# Altium footprint library Indruino.PcbLib: 383 footprints (part 13 of 24)
Each footprint in its own frame and in the unit in brackets; x right, y up, seen from the top. Pads: shape width x height; smd on the part's side, far side on the other; paste and mask are expansions set on the pad; w line width, h text height; cw(c..) or ccw(c..) is an arc to the next point about the centre after c.
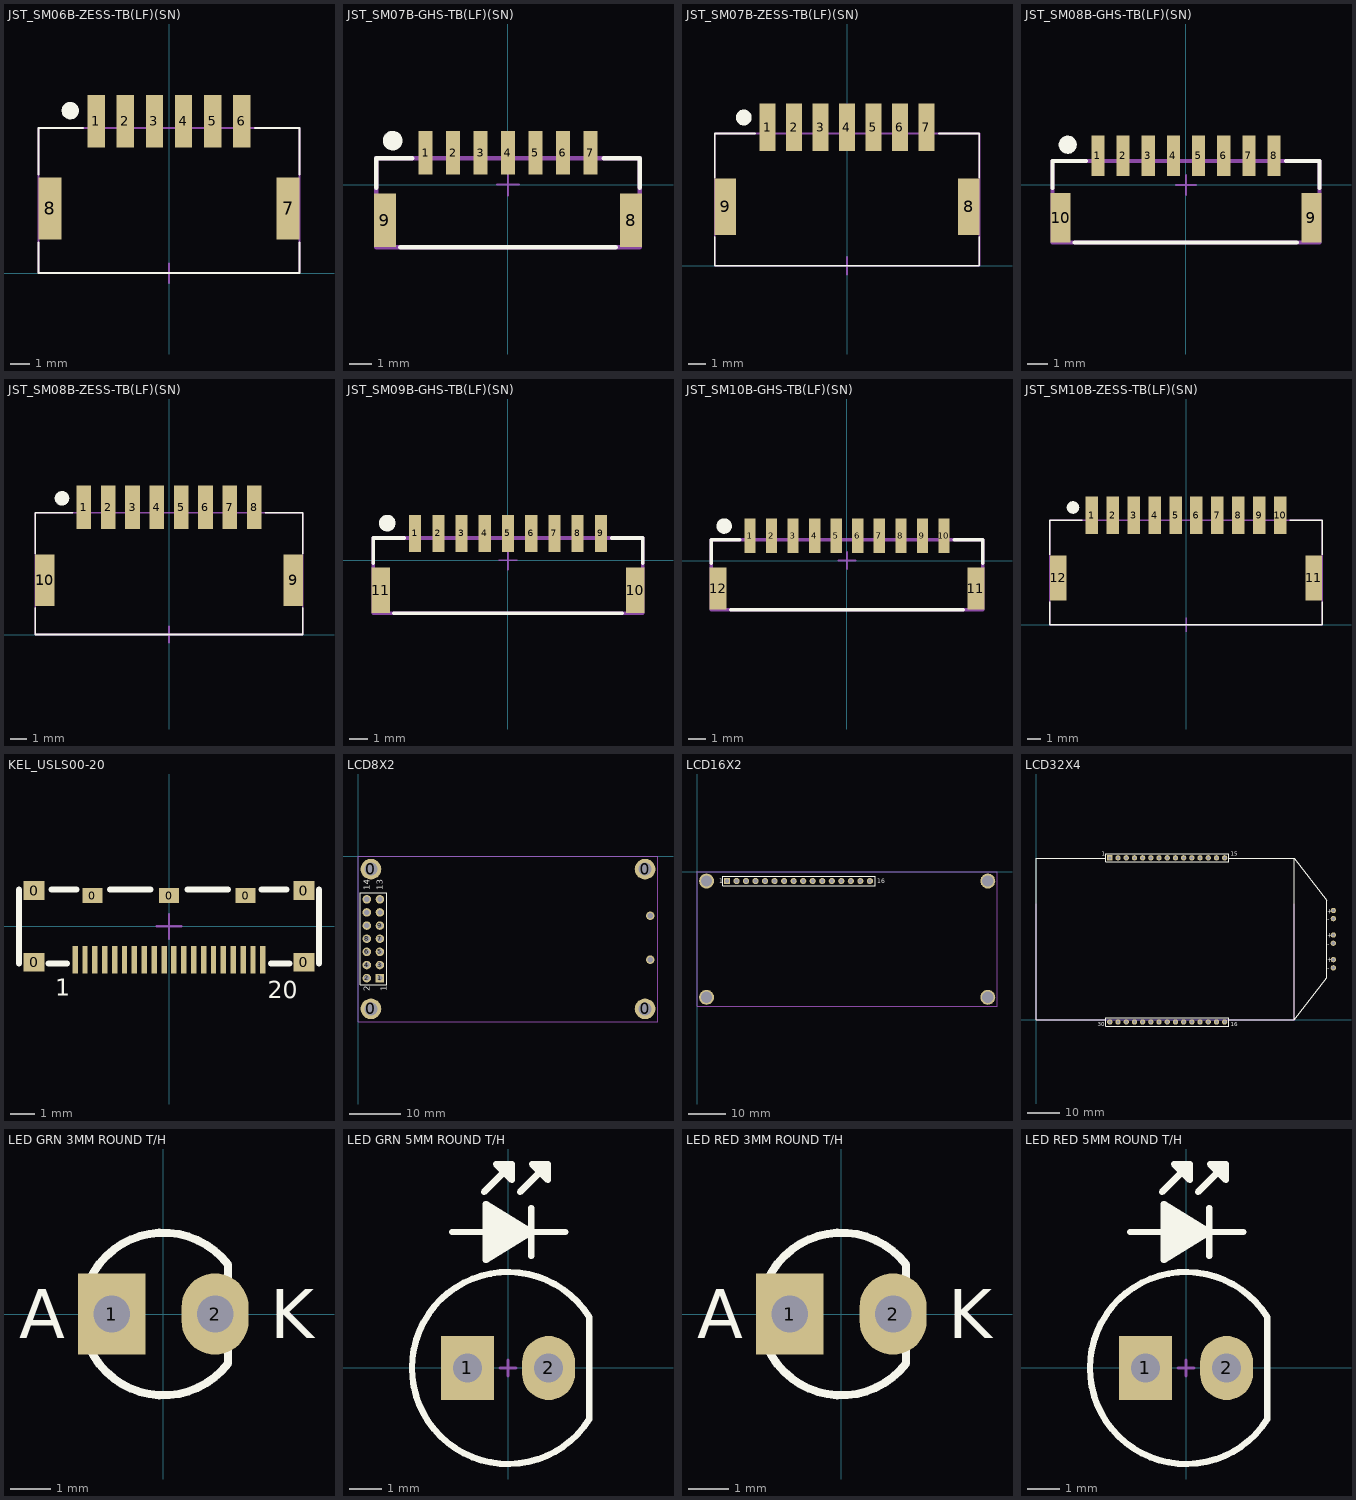
[diagram p12: the footprints below, top view; thin cyan lines are the x and y axes]

## JST_SM06B-ZESS-TB(LF)(SN) [mm]
pads (8):
  rect 0.9x2.7 smd: 1(-3.75,7.85) 2(-2.25,7.85) 3(-0.75,7.85) 4(0.75,7.85) 5(2.25,7.85) 6(3.75,7.85)
  rect 1.2x3.2 smd: 7(6.15,3.35) 8(-6.15,3.35)
Top Overlay:
  circle w0.2: c-5.1,8.4 r0.35
  region: -5.1,8.05 -5.17,8.05 -5.298,8.103 -5.397,8.202 -5.45,8.33 -5.45,8.4 -5.45,8.47 -5.397,8.598 -5.298,8.697 -5.17,8.75 -5.1,8.75 -5.03,8.75 -4.902,8.697 -4.803,8.598 -4.75,8.47 -4.75,8.4 -4.75,8.33 -4.803,8.202 -4.902,8.103 -5.03,8.05
  lines w0.1: -6.75,1.6 -6.75,0 6.75,0 6.75,1.6 ; -6.75,5.1 -6.75,7.5 -4.45,7.5 ; 4.45,7.5 6.75,7.5 6.75,5.1
Mechanical 13:
  lines w0.1: -6.75,0 6.75,0 6.75,7.5 -6.75,7.5 -6.75,0
Mechanical 15:
  lines w0.1: -0.5,0 0.5,0 ; 0,-0.5 0,0.5
3D body "ZER-06V-S.STEP": height 5.9, standoff 0.2, extent -5.4,-1.9 5.4,5.6
3D body "SM06B-ZESS-TB.STEP": height 5.9, standoff 0, extent -6.75,0 6.75,8.7

## JST_SM07B-GHS-TB(LF)(SN) [mm]
pads (9):
  rect 0.65x2 smd: 1(-3.75,1.45) 2(-2.5,1.45) 3(-1.25,1.45) 4(0,1.45) 5(1.25,1.45) 6(2.5,1.45) 7(3.75,1.45)
  rect 1x2.45 smd: 8(5.6,-1.625) 9(-5.6,-1.625)
Top Overlay:
  circle w0.2: c-5.25,2 r0.35
  region: -5.25,1.65 -5.32,1.65 -5.448,1.703 -5.547,1.802 -5.6,1.93 -5.6,2 -5.6,2.07 -5.547,2.198 -5.448,2.297 -5.32,2.35 -5.25,2.35 -5.18,2.35 -5.052,2.297 -4.953,2.198 -4.9,2.07 -4.9,2 -4.9,1.93 -4.953,1.802 -5.052,1.703 -5.18,1.65
  lines w0.2: -6,-0.15 -6,1.2 -4.35,1.2 ; -4.9,-2.85 4.9,-2.85 ; 4.35,1.2 6,1.2 6,-0.15
Mechanical 13:
  lines w0.2: -6,-2.85 6,-2.85 6,1.2 -6,1.2 -6,-2.85
Mechanical 15:
  lines w0.1: -0.5,0 0.5,0 ; 0,-0.5 0,0.5
3D body "SM07B-GHS-TB.STEP": height 4.35, standoff 0, extent -6,-2.85 6,2
3D body "GHR-07V-S.STEP": height 4.43, standoff 0.28, extent -5,-5.96 5,-0.26

## JST_SM07B-ZESS-TB(LF)(SN) [mm]
pads (9):
  rect 0.9x2.7 smd: 1(-4.5,7.85) 2(-3,7.85) 3(-1.5,7.85) 4(0,7.85) 5(1.5,7.85) 6(3,7.85) 7(4.5,7.85)
  rect 1.2x3.2 smd: 8(6.9,3.35) 9(-6.9,3.35)
Top Overlay:
  circle w0.2: c-5.85,8.4 r0.35
  region: -5.85,8.05 -5.92,8.05 -6.048,8.103 -6.147,8.202 -6.2,8.33 -6.2,8.4 -6.2,8.47 -6.147,8.598 -6.048,8.697 -5.92,8.75 -5.85,8.75 -5.78,8.75 -5.652,8.697 -5.553,8.598 -5.5,8.47 -5.5,8.4 -5.5,8.33 -5.553,8.202 -5.652,8.103 -5.78,8.05
  lines w0.1: -7.5,1.65 -7.5,0 7.5,0 7.5,1.65 ; -7.5,5 -7.5,7.5 -5.2,7.5 ; 5.2,7.5 7.5,7.5 7.5,5
Mechanical 13:
  lines w0.1: -7.49,0 -7.49,5.45 -7.49,7.5 5.21,7.5 7.51,7.5 7.51,5.45 7.51,0 -7.49,0
Mechanical 15:
  lines w0.1: -0.5,0 0.5,0 ; 0,-0.5 0,0.5
3D body "ZER-07V-S.STEP": height 5.9, standoff 0.2, extent -6.15,-1.9 6.15,5.6
3D body "SM07B-ZESS-TB.STEP": height 5.9, standoff 0, extent -7.5,0 7.5,8.7

## JST_SM08B-GHS-TB(LF)(SN) [mm]
pads (10):
  rect 0.65x2 smd: 1(-4.375,1.45) 2(-3.125,1.45) 3(-1.875,1.45) 4(-0.625,1.45) 5(0.625,1.45) 6(1.875,1.45) 7(3.125,1.45) 8(4.375,1.45)
  rect 1x2.45 smd: 9(6.225,-1.625) 10(-6.225,-1.625)
Top Overlay:
  circle w0.2: c-5.875,2 r0.35
  region: -5.875,1.65 -5.945,1.65 -6.073,1.703 -6.172,1.802 -6.225,1.93 -6.225,2 -6.225,2.07 -6.172,2.198 -6.073,2.297 -5.945,2.35 -5.875,2.35 -5.805,2.35 -5.677,2.297 -5.578,2.198 -5.525,2.07 -5.525,2 -5.525,1.93 -5.578,1.802 -5.677,1.703 -5.805,1.65
  lines w0.2: -6.625,-0.15 -6.625,1.2 -4.975,1.2 ; -5.525,-2.85 5.5,-2.85 ; 4.975,1.2 6.625,1.2 6.625,-0.15
Mechanical 13:
  lines w0.2: -6.625,-2.85 -6.625,1.2 6.625,1.2 6.625,-2.85 -6.625,-2.85
Mechanical 15:
  lines w0.1: -0.5,0 0.5,0 ; 0,-0.5 0,0.5
3D body "SM08B-GHS-TB.STEP": height 4.35, standoff -0.05, extent -6.625,-2.85 6.625,2
3D body "GHR-08V-S.STEP": height 4.5, standoff 0.35, extent -5.625,-5.99 5.625,-0.29

## JST_SM08B-ZESS-TB(LF)(SN) [mm]
pads (10):
  rect 0.9x2.7 smd: 1(-5.25,7.85) 2(-3.75,7.85) 3(-2.25,7.85) 4(-0.75,7.85) 5(0.75,7.85) 6(2.25,7.85) 7(3.75,7.85) 8(5.25,7.85)
  rect 1.2x3.2 smd: 9(7.65,3.35) 10(-7.65,3.35)
Top Overlay:
  circle w0.2: c-6.6,8.4 r0.35
  region: -6.6,8.05 -6.67,8.05 -6.798,8.103 -6.897,8.202 -6.95,8.33 -6.95,8.4 -6.95,8.47 -6.897,8.598 -6.798,8.697 -6.67,8.75 -6.6,8.75 -6.53,8.75 -6.402,8.697 -6.303,8.598 -6.25,8.47 -6.25,8.4 -6.25,8.33 -6.303,8.202 -6.402,8.103 -6.53,8.05
  lines w0.1: -8.25,1.65 -8.25,0 8.25,0 8.25,1.65 ; -8.25,5 -8.25,7.5 -5.95,7.5 ; 5.95,7.5 8.25,7.5 8.25,5
Mechanical 13:
  lines w0.1: -8.25,0 8.25,0 8.25,7.5 -8.25,7.5 -8.25,0
Mechanical 15:
  lines w0.1: -0.5,0 0.5,0 ; 0,-0.5 0,0.5
3D body "ZER-08V-S.STEP": height 5.9, standoff 0.2, extent -6.9,-1.9 6.9,5.6
3D body "SM08B-ZESS-TB.STEP": height 5.9, standoff 0, extent -8.25,0 8.25,8.7

## JST_SM09B-GHS-TB(LF)(SN) [mm]
pads (11):
  rect 0.65x2 smd: 1(-5,1.45) 2(-3.75,1.45) 3(-2.5,1.45) 4(-1.25,1.45) 5(0,1.45) 6(1.25,1.45) 7(2.5,1.45) 8(3.75,1.45) 9(5,1.45)
  rect 1x2.45 smd: 10(6.85,-1.625) 11(-6.85,-1.625)
Top Overlay:
  circle w0.2: c-6.5,2 r0.35
  region: -6.5,1.65 -6.57,1.65 -6.698,1.703 -6.797,1.802 -6.85,1.93 -6.85,2 -6.85,2.07 -6.797,2.198 -6.698,2.297 -6.57,2.35 -6.5,2.35 -6.43,2.35 -6.302,2.297 -6.203,2.198 -6.15,2.07 -6.15,2 -6.15,1.93 -6.203,1.802 -6.302,1.703 -6.43,1.65
  lines w0.2: -7.25,-0.15 -7.25,1.2 -5.6,1.2 ; -6.15,-2.85 6.15,-2.85 ; 5.6,1.2 7.25,1.2 7.25,-0.15
Mechanical 13:
  lines w0.2: -7.25,-2.85 7.25,-2.85 7.25,1.2 -7.25,1.2 -7.25,-2.85
Mechanical 15:
  lines w0.1: -0.5,0 0.5,0 ; 0,-0.5 0,0.5
3D body "GHR-09V-S.STEP": height 4.5, standoff 0.35, extent -6.25,-5.99 6.25,-0.29
3D body "SM09B-GHS-TB.STEP": height 4.35, standoff 0, extent -7.25,-2.85 7.25,2

## JST_SM10B-GHS-TB(LF)(SN) [mm]
pads (12):
  rect 0.65x2 smd: 1(-5.625,1.45) 2(-4.375,1.45) 3(-3.125,1.45) 4(-1.875,1.45) 5(-0.625,1.45) 6(0.625,1.45) 7(1.875,1.45) 8(3.125,1.45) 9(4.375,1.45) 10(5.625,1.45)
  rect 1x2.45 smd: 11(7.475,-1.625) 12(-7.475,-1.625)
Top Overlay:
  circle w0.2: c-7.125,2 r0.35
  region: -7.125,1.65 -7.195,1.65 -7.323,1.703 -7.422,1.802 -7.475,1.93 -7.475,2 -7.475,2.07 -7.422,2.198 -7.323,2.297 -7.195,2.35 -7.125,2.35 -7.055,2.35 -6.927,2.297 -6.828,2.198 -6.775,2.07 -6.775,2 -6.775,1.93 -6.828,1.802 -6.927,1.703 -7.055,1.65
  lines w0.2: -7.875,-0.15 -7.875,1.2 -6.225,1.2 ; -6.75,-2.85 6.75,-2.85 ; 6.225,1.2 7.875,1.2 7.875,-0.15
Mechanical 13:
  lines w0.2: -7.875,-2.85 -7.875,1.2 7.875,1.2 7.875,-2.85 -7.875,-2.85
Mechanical 15:
  lines w0.1: -0.5,0 0.5,0 ; 0,-0.5 0,0.5
3D body "SM10B-GHS-TB.STEP": height 4.35, standoff 0, extent -7.875,-2.85 7.875,2
3D body "GHR-10V-S.STEP": height 4.43, standoff 0.28, extent -6.875,-6 6.875,-0.3

## JST_SM10B-ZESS-TB(LF)(SN) [mm]
pads (12):
  rect 0.9x2.7 smd: 1(-6.75,7.85) 2(-5.25,7.85) 3(-3.75,7.85) 4(-2.25,7.85) 5(-0.75,7.85) 6(0.75,7.85) 7(2.25,7.85) 8(3.75,7.85) 9(5.25,7.85) 10(6.75,7.85)
  rect 1.2x3.2 smd: 11(9.15,3.35) 12(-9.15,3.35)
Top Overlay:
  circle w0.2: c-8.1,8.4 r0.35
  region: -8.1,8.05 -8.17,8.05 -8.298,8.103 -8.397,8.202 -8.45,8.33 -8.45,8.4 -8.45,8.47 -8.397,8.598 -8.298,8.697 -8.17,8.75 -8.1,8.75 -8.03,8.75 -7.902,8.697 -7.803,8.598 -7.75,8.47 -7.75,8.4 -7.75,8.33 -7.803,8.202 -7.902,8.103 -8.03,8.05
  lines w0.1: -9.75,1.65 -9.75,0 9.75,0 9.75,1.65 ; -9.75,5 -9.75,7.5 -7.45,7.5 ; 7.45,7.5 9.75,7.5 9.75,5
Mechanical 13:
  lines w0.1: -9.75,0 -9.75,7.5 9.75,7.5 9.75,0 -9.75,0
Mechanical 15:
  lines w0.1: -0.5,0 0.5,0 ; 0,-0.5 0,0.5
3D body "SM10B-ZESS-TB.STEP": height 5.9, standoff 0, extent -9.75,0 9.75,8.7
3D body "ZER-10V-S.STEP": height 6.25, standoff 0.55, extent -8.4,-1.875 8.4,5.625

## KEL_USLS00-20 [mm] "0.4MM PITCH IDC CONNECTOR FOR MICRO COAXIAL CABLE"
pads (27):
  rect 0.86x0.76 smd: 0(-5.46,-1.45) 0(-5.46,1.45) 0(5.46,-1.45) 0(5.46,1.45)
  rect 0.8x0.6 smd: 0(-3.1,1.25) 0(0,1.25) 0(3.1,1.25)
  rect 0.22x1.1 smd: 1(-3.8,-1.35) 2(-3.4,-1.35) 3(-3,-1.35) 4(-2.6,-1.35) 5(-2.2,-1.35) 6(-1.8,-1.35) 7(-1.4,-1.35) 8(-1,-1.35) 9(-0.6,-1.35) 10(-0.2,-1.35) 11(0.2,-1.35) 12(0.6,-1.35) 13(1,-1.35) 14(1.4,-1.35) 15(1.8,-1.35) 16(2.2,-1.35) 17(2.6,-1.35) 18(3,-1.35) 19(3.4,-1.35) 20(3.8,-1.35)
Top Overlay:
  lines w0.254: -6.07,-1.49 -6.07,1.49 ; -4.875,-1.5 -4.125,-1.5 ; -4.75,1.49 -3.75,1.49 ; -2.375,1.49 -0.75,1.49 ; 0.75,1.49 2.375,1.49 ; 3.75,1.49 4.75,1.49 ; 4.125,-1.5 4.875,-1.5 ; 6.07,-1.49 6.07,1.49
  text "20" at 4,-2.9 h0.7
  text "1" at -4.6,-2.8 h0.7
Mechanical 15:
  lines w0.1: -0.5,0 0.5,0 ; 0,-0.5 0,0.5
3D body: height 0.9, standoff 0.04, extent -6.07,-1.49 6.07,1.49

## LCD8X2 [mm] "LCD 8x2"
pads (20):
  round 4 hole 2.5: 0(2.5,-29.5) 0(55.5,-29.5)
  round 4 hole 2.5 paste-2539.97: 0(2.5,-2.5) 0(55.5,-2.5)
  rect 1.65x1.65 hole 1: 1(4.241,-23.57)
  round 1.65 hole 1: 2(1.701,-23.57) 3(4.241,-21.03) 4(1.701,-21.03) 5(4.241,-18.49) 6(1.701,-18.49) 7(4.241,-15.95) 8(1.701,-15.95) 9(4.241,-13.41) 10(1.701,-13.41) 11(4.241,-10.87) 12(1.701,-10.87) 13(4.241,-8.33) 14(1.701,-8.33) 15(56.5,-11.5) 16(56.5,-20)
Top Overlay:
  lines w0.2: 0.431,-24.84 5.511,-24.84 5.511,-7.06 0.431,-7.06 0.431,-24.84
  text "14" at 2.261,-6.585 h1.2
  text "1" at 5.511,-26.11 h1.2
  text "2" at 2.261,-26.11 h1.2
  text "13" at 4.801,-6.585 h1.2
Mechanical 13:
  lines w0.2: 0,-32 0,0 58,0 58,-32 0,-32
3D body "User Library-lcd_8x2.STEP": height 11.2, standoff 2.99, extent 0,-32 58,0
3D body "header_7x1pin_male.stp": height 8.54, standoff -3, extent 0.431,-24.855 2.971,-7.075
3D body "header_7x1pin_male.stp": height 8.54, standoff -3, extent 2.971,-24.855 5.511,-7.075

## LCD16X2 [mm] "LCD 16x2"
pads (20):
  rect 1.65x1.65 hole 1: 1(8,-2.54)
  round 1.65 hole 1: 2(10.54,-2.54) 3(13.08,-2.54) 4(15.62,-2.54) 5(18.16,-2.54) 6(20.7,-2.54) 7(23.24,-2.54) 8(25.78,-2.54) 9(28.32,-2.54) 10(30.86,-2.54) 11(33.4,-2.54) 12(35.94,-2.54) 13(38.48,-2.54) 14(41.02,-2.54) 15(43.56,-2.54) 16(46.1,-2.54)
  round 4 hole 3: ""(2.54,-33.54) ""(77.54,-33.54)
  round 4 hole 3 paste-2539.97: ""(2.54,-2.54) ""(77.54,-2.54)
Top Overlay:
  lines w0.2: 6.858,-3.81 47.498,-3.81 47.498,-1.27 6.858,-1.27 6.858,-3.81
  text "16" at 48.1,-3.1 h1.2
  text "1" at 5.9,-3.1 h1.2
Mechanical 13:
  lines w0.2: 0,-36 0,0 80,0 80,-36 0,-36
3D body "header_8x1pin_male.stp": height 8.54, standoff -3, extent 27.05,-3.791 47.37,-1.251
3D body "header_8x1pin_male.stp": height 8.54, standoff -3, extent 6.73,-3.791 27.05,-1.251
3D body "User Library-LCD16x02.step": height 17, standoff 3.1, extent 0,-36 80,0

## LCD32X4 [mm] "LCD 32x4"
pads (36):
  rect 1.65x1.65 hole 1: 1(22.86,50.165)
  round 1.65 hole 1: 2(25.4,50.165) 3(27.94,50.165) 4(30.48,50.165) 5(33.02,50.165) 6(35.56,50.165) 7(38.1,50.165) 8(40.64,50.165) 9(43.18,50.165) 10(45.72,50.165) 11(48.26,50.165) 12(50.8,50.165) 13(53.34,50.165) 14(55.88,50.165) 15(58.42,50.165) 16(58.42,-0.635) 17(55.88,-0.635) 18(53.34,-0.635) 19(50.8,-0.635) 20(48.26,-0.635) 21(45.72,-0.635) 22(43.18,-0.635) 23(40.64,-0.635) 24(38.1,-0.635) 25(35.56,-0.635) 26(33.02,-0.635) 27(30.48,-0.635) 28(27.94,-0.635) 29(25.4,-0.635) 30(22.86,-0.635) 31(92.075,33.89) 32(92.075,31.35) 33(92.075,26.27) 34(92.075,23.73) 35(92.075,18.65) 36(92.075,16.11)
Top Overlay:
  lines w0.2: 21.59,0 0,0 0,50 21.59,50 ; 59.69,0 80,0 ; 59.69,50 80,50 ; 80,0 90,13 90,37 80,50 ; 80,0 80,50 ; 21.59,-1.905 59.69,-1.905 59.69,0.635 21.59,0.635 21.59,-1.905 ; 21.59,48.895 21.59,51.435 59.69,51.435 59.69,48.895 21.59,48.895
  text "1" at 20.32,50.8 h1.2
  text "15" at 60.325,50.8 h1.2
  text "16" at 60.325,-1.905 h1.2
  text "30" at 19.05,-1.905 h1.2
  text "+" at 90.151,32.873 h1.52
  text "+" at 90.151,25.373 h1.52
  text "+" at 90.151,17.873 h1.52
  text "-" at 90.151,15.373 h1.52
  text "-" at 90.151,22.873 h1.52
  text "-" at 90.151,30.373 h1.52
Mechanical 13:
  lines w0.2: 0,36 0,0 80,0 80,36
3D body: height 8, standoff 0, extent 0,0 90,50

## LED GRN 3MM ROUND T/H [mm]
pads (2):
  rect 1.65x2 hole 0.9: 1(-1.27,0)
  oval 1.65x2 hole 0.9: 2(1.27,0)
Top Overlay:
  lines w0.2: 1.592,-1.21 cw(c0,0) 1.592,1.21 1.592,-1.21
  text "K" at 2.625,-0.6 h1.2
  text "A" at -3.55,-0.6 h1.2
3D body "User Library-LED GREEN 3mm.step": height 5.3, standoff -5, extent -1.9,-1.899 1.6,1.9

## LED GRN 5MM ROUND T/H [mm]
pads (2):
  rect 1.65x2 hole 0.9: 1(-1.27,0)
  oval 1.65x2 hole 0.9: 2(1.27,0)
Top Overlay:
  region: -0.689,3.375 0.725,4.25 -0.689,5.125
  region: 0.125,5.875 -0.375,6.375 0.125,6.375
  region: 0.75,6.375 1.25,6.375 1.25,5.875
  lines w0.2: -1.75,4.25 -0.689,4.25 ; -0.75,5.5 0.125,6.375 ; 0.375,5.5 1.25,6.375 ; 0.725,3.5 0.725,5 ; 1.786,4.25 0.725,4.25 ; 2.538,-1.599 cw(c0,0) 2.541,1.594 ; 2.54,-1.599 2.54,1.594 ; 0.125,6.375 -0.375,6.375 0.125,5.875 0.125,6.375 ; 0.725,4.25 -0.689,3.375 -0.689,5.125 0.725,4.25 ; 1.25,6.375 1.25,5.875 0.75,6.375 1.25,6.375
Mechanical 15:
  lines w0.1: -0.25,0 0.25,0 ; 0,-0.25 0,0.25
3D body "LED 5mm Green.step": height 8.8, standoff -5.5, extent -2.8,-2.799 2.5,2.8

## LED RED 3MM ROUND T/H [mm]
pads (2):
  rect 1.65x2 hole 0.9: 1(-1.27,0)
  oval 1.65x2 hole 0.9: 2(1.27,0)
Top Overlay:
  lines w0.2: 1.592,-1.21 cw(c0,0) 1.592,1.21 1.592,-1.21
  text "A" at -3.55,-0.6 h1.2
  text "K" at 2.625,-0.6 h1.2
3D body "User Library-LED RED 3mm.step": height 5.3, standoff -5, extent -1.9,-1.899 1.6,1.9

## LED RED 5MM ROUND T/H [mm]
pads (2):
  rect 1.65x2 hole 0.9: 1(-1.27,0)
  oval 1.65x2 hole 0.9: 2(1.27,0)
Top Overlay:
  region: 0.75,6.375 1.25,6.375 1.25,5.875
  region: 0.125,5.875 -0.375,6.375 0.125,6.375
  region: -0.689,3.375 0.725,4.25 -0.689,5.125
  lines w0.2: -1.75,4.25 -0.689,4.25 ; -0.75,5.5 0.125,6.375 ; 0.375,5.5 1.25,6.375 ; 0.725,3.5 0.725,5 ; 1.786,4.25 0.725,4.25 ; 2.538,-1.599 cw(c0,0) 2.541,1.594 ; 2.54,-1.599 2.54,1.594 ; 0.125,6.375 0.125,5.875 -0.375,6.375 0.125,6.375 ; 0.725,4.25 -0.689,5.125 -0.689,3.375 0.725,4.25 ; 1.25,6.375 0.75,6.375 1.25,5.875 1.25,6.375
Mechanical 15:
  lines w0.1: -0.25,0 0.25,0 ; 0,-0.25 0,0.25
3D body "LED 5mm Red.step": height 8.8, standoff -5.5, extent -2.8,-2.799 2.5,2.799